# Altium footprint library smd-ipc.PCBLIB: 363 footprints (part 10 of 27)
Each footprint in its own frame and in the unit in brackets; x right, y up, seen from the top. Pads: shape width x height; smd on the part's side, far side on the other; paste and mask are expansions set on the pad; w line width, h text height; cw(c..) or ccw(c..) is an arc to the next point about the centre after c.
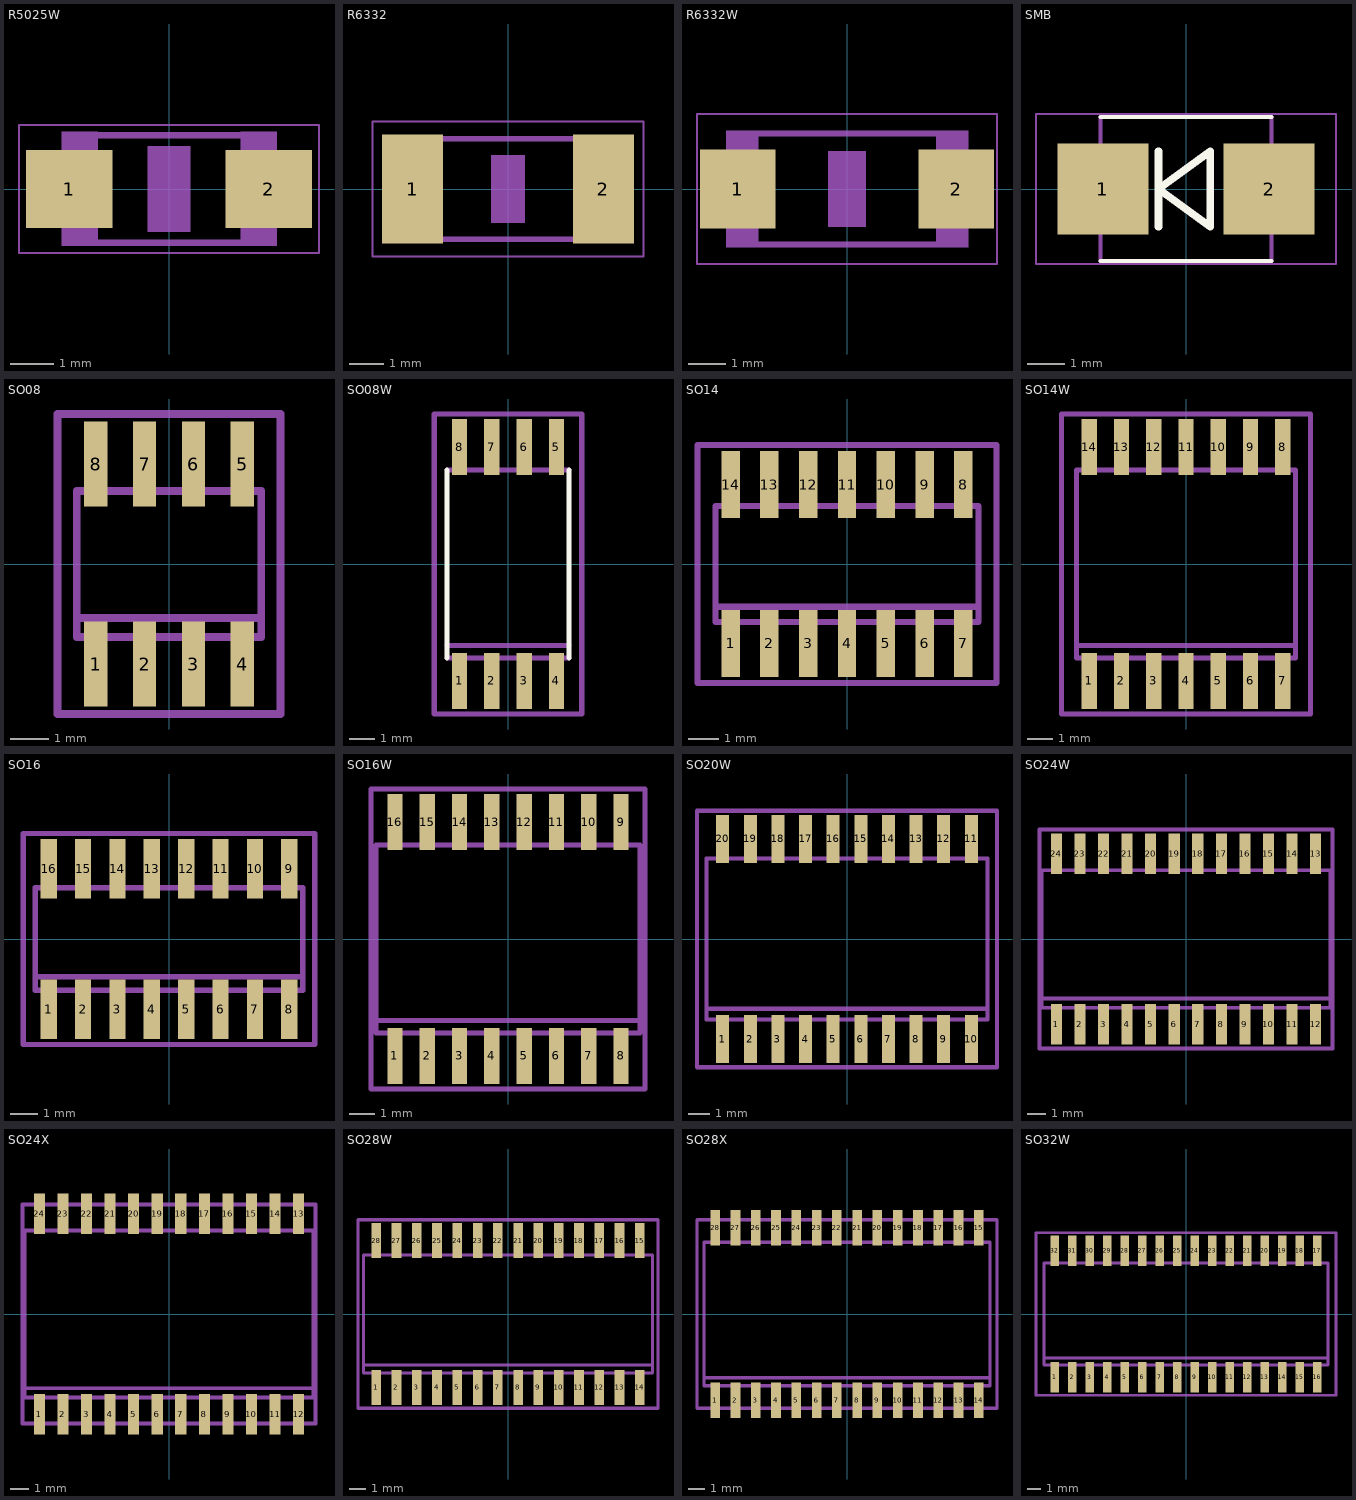
[diagram p9: the footprints below, top view; thin cyan lines are the x and y axes]

## R5025W [mm]
pads (2):
  rect 2x1.8 smd: 1(-2.311,0) 2(2.311,0)
Mechanical 6:
  rectangle: -0.5,-1 0.5,1
Mechanical 16:
  rectangle: -2.489,-1.321 -1.639,1.329
  rectangle: 1.651,-1.321 2.501,1.329
  lines w0.152: -1.662,1.245 1.662,1.245 ; -1.637,-1.245 1.687,-1.245
Mechanical 27:
  lines w0.051: -3.473,-1.483 3.473,-1.483 3.473,1.483 -3.473,1.483 -3.473,-1.483

## R6332 [mm]
pads (2):
  rect 1.8x3.2 smd: 1(-2.8,0) 2(2.8,0)
Mechanical 6:
  rectangle: -0.5,-1 0.5,1
Mechanical 16:
  rectangle: -3.2,-1.549 -2.351,1.551
  rectangle: 2.362,-1.549 3.212,1.551
  lines w0.152: -2.362,-1.473 2.387,-1.473 ; -2.362,1.473 2.387,1.473
Mechanical 27:
  lines w0.051: -3.973,-1.983 3.973,-1.983 3.973,1.983 -3.973,1.983 -3.973,-1.983

## R6332W [mm]
pads (2):
  rect 2x2.1 smd: 1(-2.896,0) 2(2.896,0)
Mechanical 6:
  rectangle: -0.5,-1 0.5,1
Mechanical 16:
  rectangle: -3.2,-1.549 -2.351,1.551
  rectangle: 2.362,-1.549 3.212,1.551
  lines w0.152: -2.362,-1.473 2.387,-1.473 ; -2.362,1.473 2.387,1.473
Mechanical 27:
  lines w0.051: -3.973,-1.983 3.973,-1.983 3.973,1.983 -3.973,1.983 -3.973,-1.983

## SMB [mm]
pads (2):
  rect 2.4x2.4 smd: 1(-2.2,0) 2(2.2,0)
Top Overlay:
  lines w0.102: -2.261,-1.905 2.261,-1.905 ; -2.261,1.905 2.261,1.905
  lines w0.203: -0.73,-1 -0.73,1 ; -0.73,0 0.643,1 0.643,-1 -0.73,0
Mechanical 16:
  rectangle: -2.794,-1.092 -2.261,1.092
  rectangle: 2.261,-1.092 2.794,1.092
  lines w0.102: -2.261,-1.905 -2.261,1.905 ; 2.261,-1.905 2.261,1.905
Mechanical 27:
  lines w0.051: -3.973,-1.983 3.973,-1.983 3.973,1.983 -3.973,1.983 -3.973,-1.983

## SO08 [mm]
pads (8):
  rect 0.6x2.2 smd: 1(-1.905,-2.6) 2(-0.635,-2.6) 3(0.635,-2.6) 4(1.905,-2.6) 5(1.905,2.6) 6(0.635,2.6) 7(-0.635,2.6) 8(-1.905,2.6)
Mechanical 16:
  rectangle: -2.15,-3.1 -1.66,-2
  rectangle: -0.88,-3.1 -0.39,-2
  rectangle: 0.39,-3.1 0.88,-2
  rectangle: 1.66,-3.1 2.15,-2
  rectangle: 1.66,2 2.15,3.1
  rectangle: 0.39,2 0.88,3.1
  rectangle: -0.88,2 -0.39,3.1
  rectangle: -2.15,2 -1.66,3.1
  lines w0.203: -2.4,-1.4 -2.4,-1.9 2.4,-1.9 2.4,-1.4 ; -2.4,-1.4 -2.4,1.9 2.4,1.9 2.4,-1.4 ; -2.4,-1.4 2.4,-1.4
Mechanical 27:
  lines w0.2: -2.9,-3.9 2.9,-3.9 2.9,3.9 -2.9,3.9 -2.9,-3.9

## SO08W [mm]
pads (8):
  rect 0.6x2.2 smd: 1(-1.905,-4.6) 2(-0.635,-4.6) 3(0.635,-4.6) 4(1.905,-4.6) 5(1.905,4.6) 6(0.635,4.6) 7(-0.635,4.6) 8(-1.905,4.6)
Top Overlay:
  lines w0.203: -2.4,-3.7 -2.4,3.7 ; 2.4,-3.7 2.4,3.7
Mechanical 16:
  rectangle: -2.15,-5.32 -1.66,-3.8
  rectangle: -0.88,-5.32 -0.39,-3.8
  rectangle: 0.39,-5.32 0.88,-3.8
  rectangle: 1.66,-5.32 2.15,-3.8
  rectangle: 1.66,3.8 2.15,5.32
  rectangle: 0.39,3.8 0.88,5.32
  rectangle: -0.88,3.8 -0.39,5.32
  rectangle: -2.15,3.8 -1.66,5.32
  lines w0.203: -2.4,-3.7 2.4,-3.7 ; -2.4,-3.2 2.4,-3.2 ; -2.4,3.7 2.4,3.7
Mechanical 27:
  lines w0.2: -2.9,-5.9 2.9,-5.9 2.9,5.9 -2.9,5.9 -2.9,-5.9

## SO14 [mm]
pads (14):
  rect 0.6x2.2 smd: 1(-3.81,-2.6) 2(-2.54,-2.6) 3(-1.27,-2.6) 4(0,-2.6) 5(1.27,-2.6) 6(2.54,-2.6) 7(3.81,-2.6) 8(3.81,2.6) 9(2.54,2.6) 10(1.27,2.6) 11(0,2.6) 12(-1.27,2.6) 13(-2.54,2.6) 14(-3.81,2.6)
Mechanical 16:
  rectangle: -4.055,-3.1 -3.565,-2
  rectangle: -2.785,-3.1 -2.295,-2
  rectangle: -1.515,-3.1 -1.025,-2
  rectangle: -0.245,-3.1 0.245,-2
  rectangle: -0.245,2 0.245,3.1
  rectangle: -1.515,2 -1.025,3.1
  rectangle: -2.785,2 -2.295,3.1
  rectangle: -4.055,2 -3.565,3.1
  rectangle: 1.025,-3.1 1.515,-2
  rectangle: 2.295,-3.1 2.785,-2
  rectangle: 3.565,-3.1 4.055,-2
  rectangle: 3.565,2 4.055,3.1
  rectangle: 2.295,2 2.785,3.1
  rectangle: 1.025,2 1.515,3.1
  lines w0.203: -4.305,-1.4 -4.305,-1.9 4.305,-1.9 4.305,-1.4 ; -4.305,-1.4 -4.305,1.9 4.305,1.9 4.305,-1.4 ; -4.305,-1.4 4.305,-1.4
Mechanical 27:
  lines w0.2: -4.895,-3.9 4.895,-3.9 4.895,3.9 -4.895,3.9 -4.895,-3.9

## SO14W [mm]
pads (14):
  rect 0.6x2.2 smd: 1(-3.81,-4.6) 2(-2.54,-4.6) 3(-1.27,-4.6) 4(0,-4.6) 5(1.27,-4.6) 6(2.54,-4.6) 7(3.81,-4.6) 8(3.81,4.6) 9(2.54,4.6) 10(1.27,4.6) 11(0,4.6) 12(-1.27,4.6) 13(-2.54,4.6) 14(-3.81,4.6)
Mechanical 16:
  rectangle: -4.055,-5.32 -3.565,-3.8
  rectangle: -2.785,-5.32 -2.295,-3.8
  rectangle: -1.515,-5.32 -1.025,-3.8
  rectangle: -0.245,-5.32 0.245,-3.8
  rectangle: 1.025,-5.32 1.515,-3.8
  rectangle: 2.295,-5.32 2.785,-3.8
  rectangle: 3.565,-5.32 4.055,-3.8
  rectangle: 3.565,3.8 4.055,5.32
  rectangle: 2.295,3.8 2.785,5.32
  rectangle: 1.025,3.8 1.515,5.32
  rectangle: -0.245,3.8 0.245,5.32
  rectangle: -1.515,3.8 -1.025,5.32
  rectangle: -2.785,3.8 -2.295,5.32
  rectangle: -4.055,3.8 -3.565,5.32
  lines w0.203: -4.305,-3.2 -4.305,-3.7 4.305,-3.7 4.305,-3.2 ; -4.305,-3.2 -4.305,3.7 4.305,3.7 4.305,-3.2 ; -4.305,-3.2 4.305,-3.2
Mechanical 27:
  lines w0.2: -4.895,-5.9 4.895,-5.9 4.895,5.9 -4.895,5.9 -4.895,-5.9

## SO16 [mm]
pads (16):
  rect 0.6x2.2 smd: 1(-4.445,-2.6) 2(-3.175,-2.6) 3(-1.905,-2.6) 4(-0.635,-2.6) 5(0.635,-2.6) 6(1.905,-2.6) 7(3.175,-2.6) 8(4.445,-2.6) 9(4.445,2.6) 10(3.175,2.6) 11(1.905,2.6) 12(0.635,2.6) 13(-0.635,2.6) 14(-1.905,2.6) 15(-3.175,2.6) 16(-4.445,2.6)
Mechanical 16:
  rectangle: -4.69,-3.1 -4.2,-2
  rectangle: -3.42,-3.1 -2.93,-2
  rectangle: -2.15,-3.1 -1.66,-2
  rectangle: -0.88,-3.1 -0.39,-2
  rectangle: 1.66,2 2.15,3.1
  rectangle: 0.39,2 0.88,3.1
  rectangle: -0.88,2 -0.39,3.1
  rectangle: -2.15,2 -1.66,3.1
  rectangle: 0.39,-3.1 0.88,-2
  rectangle: 1.66,-3.1 2.15,-2
  rectangle: 2.93,-3.1 3.42,-2
  rectangle: 4.2,-3.1 4.69,-2
  rectangle: 4.2,2 4.69,3.1
  rectangle: 2.93,2 3.42,3.1
  rectangle: -3.42,2 -2.93,3.1
  rectangle: -4.69,2 -4.2,3.1
  lines w0.203: -4.94,-1.4 -4.94,-1.9 4.94,-1.9 4.94,-1.4 ; -4.94,-1.4 -4.94,1.9 4.94,1.9 4.94,-1.4 ; -4.94,-1.4 4.94,-1.4
Mechanical 27:
  lines w0.2: -5.395,-3.9 5.395,-3.9 5.395,3.9 -5.395,3.9 -5.395,-3.9

## SO16W [mm]
pads (16):
  rect 0.6x2.2 smd: 1(-4.445,-4.6) 2(-3.175,-4.6) 3(-1.905,-4.6) 4(-0.635,-4.6) 5(0.635,-4.6) 6(1.905,-4.6) 7(3.175,-4.6) 8(4.445,-4.6) 9(4.445,4.6) 10(3.175,4.6) 11(1.905,4.6) 12(0.635,4.6) 13(-0.635,4.6) 14(-1.905,4.6) 15(-3.175,4.6) 16(-4.445,4.6)
Mechanical 16:
  rectangle: -4.69,-5.32 -4.2,-3.8
  rectangle: -3.42,-5.32 -2.93,-3.8
  rectangle: -2.15,-5.32 -1.66,-3.8
  rectangle: -0.88,-5.32 -0.39,-3.8
  rectangle: 0.39,-5.32 0.88,-3.8
  rectangle: 1.66,-5.32 2.15,-3.8
  rectangle: 2.93,-5.32 3.42,-3.8
  rectangle: 4.2,-5.32 4.69,-3.8
  rectangle: 4.2,3.8 4.69,5.32
  rectangle: 2.93,3.8 3.42,5.32
  rectangle: 1.66,3.8 2.15,5.32
  rectangle: 0.39,3.8 0.88,5.32
  rectangle: -0.88,3.8 -0.39,5.32
  rectangle: -2.15,3.8 -1.66,5.32
  rectangle: -3.42,3.8 -2.93,5.32
  rectangle: -4.69,3.8 -4.2,5.32
  lines w0.203: -5.19,-3.2 -5.19,-3.7 5.19,-3.7 5.19,-3.2 ; -5.19,-3.2 -5.19,3.7 5.19,3.7 5.19,-3.2 ; -5.19,-3.2 5.19,-3.2
Mechanical 27:
  lines w0.2: -5.395,-5.9 5.395,-5.9 5.395,5.9 -5.395,5.9 -5.395,-5.9

## SO20W [mm]
pads (20):
  rect 0.6x2.2 smd: 1(-5.715,-4.6) 2(-4.445,-4.6) 3(-3.175,-4.6) 4(-1.905,-4.6) 5(-0.635,-4.6) 6(0.635,-4.6) 7(1.905,-4.6) 8(3.175,-4.6) 9(4.445,-4.6) 10(5.715,-4.6) 11(5.715,4.6) 12(4.445,4.6) 13(3.175,4.6) 14(1.905,4.6) 15(0.635,4.6) 16(-0.635,4.6) 17(-1.905,4.6) 18(-3.175,4.6) 19(-4.445,4.6) 20(-5.715,4.6)
Mechanical 16:
  rectangle: -5.96,-5.32 -5.47,-3.8
  rectangle: -4.69,-5.32 -4.2,-3.8
  rectangle: -3.42,-5.32 -2.93,-3.8
  rectangle: -2.15,-5.32 -1.66,-3.8
  rectangle: -0.88,-5.32 -0.39,-3.8
  rectangle: 0.39,-5.32 0.88,-3.8
  rectangle: 1.66,-5.32 2.15,-3.8
  rectangle: 2.93,-5.32 3.42,-3.8
  rectangle: 4.2,-5.32 4.69,-3.8
  rectangle: 5.47,-5.32 5.96,-3.8
  rectangle: 5.47,3.8 5.96,5.32
  rectangle: 4.2,3.8 4.69,5.32
  rectangle: 2.93,3.8 3.42,5.32
  rectangle: 1.66,3.8 2.15,5.32
  rectangle: 0.39,3.8 0.88,5.32
  rectangle: -0.88,3.8 -0.39,5.32
  rectangle: -2.15,3.8 -1.66,5.32
  rectangle: -3.42,3.8 -2.93,5.32
  rectangle: -4.69,3.8 -4.2,5.32
  rectangle: -5.96,3.8 -5.47,5.32
  lines w0.203: -6.46,-3.2 -6.46,-3.7 6.46,-3.7 6.46,-3.2 ; -6.46,-3.2 -6.46,3.7 6.46,3.7 6.46,-3.2 ; -6.46,-3.2 6.46,-3.2
Mechanical 27:
  lines w0.2: -6.895,-5.9 6.895,-5.9 6.895,5.9 -6.895,5.9 -6.895,-5.9

## SO24W [mm]
pads (24):
  rect 0.6x2.2 smd: 1(-6.985,-4.6) 2(-5.715,-4.6) 3(-4.445,-4.6) 4(-3.175,-4.6) 5(-1.905,-4.6) 6(-0.635,-4.6) 7(0.635,-4.6) 8(1.905,-4.6) 9(3.175,-4.6) 10(4.445,-4.6) 11(5.715,-4.6) 12(6.985,-4.6) 13(6.985,4.6) 14(5.715,4.6) 15(4.445,4.6) 16(3.175,4.6) 17(1.905,4.6) 18(0.635,4.6) 19(-0.635,4.6) 20(-1.905,4.6) 21(-3.175,4.6) 22(-4.445,4.6) 23(-5.715,4.6) 24(-6.985,4.6)
Mechanical 16:
  rectangle: -7.23,-5.32 -6.74,-3.8
  rectangle: -5.96,-5.32 -5.47,-3.8
  rectangle: -4.69,-5.32 -4.2,-3.8
  rectangle: -3.42,-5.32 -2.93,-3.8
  rectangle: -2.15,-5.32 -1.66,-3.8
  rectangle: -0.88,-5.32 -0.39,-3.8
  rectangle: 0.39,-5.32 0.88,-3.8
  rectangle: 1.66,-5.32 2.15,-3.8
  rectangle: 2.93,-5.32 3.42,-3.8
  rectangle: 4.2,-5.32 4.69,-3.8
  rectangle: 5.47,-5.32 5.96,-3.8
  rectangle: 6.74,-5.32 7.23,-3.8
  rectangle: 6.74,3.8 7.23,5.32
  rectangle: 5.47,3.8 5.96,5.32
  rectangle: 4.2,3.8 4.69,5.32
  rectangle: 2.93,3.8 3.42,5.32
  rectangle: 1.66,3.8 2.15,5.32
  rectangle: 0.39,3.8 0.88,5.32
  rectangle: -0.88,3.8 -0.39,5.32
  rectangle: -2.15,3.8 -1.66,5.32
  rectangle: -3.42,3.8 -2.93,5.32
  rectangle: -4.69,3.8 -4.2,5.32
  rectangle: -5.96,3.8 -5.47,5.32
  rectangle: -7.23,3.8 -6.74,5.32
  lines w0.203: -7.78,-3.2 -7.78,-3.7 7.78,-3.7 7.78,-3.2 ; -7.78,-3.2 -7.78,3.7 7.78,3.7 7.78,-3.2 ; -7.78,-3.2 7.78,-3.2
Mechanical 27:
  lines w0.2: -7.895,-5.9 7.895,-5.9 7.895,5.9 -7.895,5.9 -7.895,-5.9

## SO24X [mm]
pads (24):
  rect 0.6x2.2 smd: 1(-6.985,-5.4) 2(-5.715,-5.4) 3(-4.445,-5.4) 4(-3.175,-5.4) 5(-1.905,-5.4) 6(-0.635,-5.4) 7(0.635,-5.4) 8(1.905,-5.4) 9(3.175,-5.4) 10(4.445,-5.4) 11(5.715,-5.4) 12(6.985,-5.4) 13(6.985,5.4) 14(5.715,5.4) 15(4.445,5.4) 16(3.175,5.4) 17(1.905,5.4) 18(0.635,5.4) 19(-0.635,5.4) 20(-1.905,5.4) 21(-3.175,5.4) 22(-4.445,5.4) 23(-5.715,5.4) 24(-6.985,5.4)
Mechanical 16:
  rectangle: -7.23,-6.12 -6.74,-4.6
  rectangle: -5.96,-6.12 -5.47,-4.6
  rectangle: -4.69,-6.12 -4.2,-4.6
  rectangle: -3.42,-6.12 -2.93,-4.6
  rectangle: -2.15,-6.12 -1.66,-4.6
  rectangle: -0.88,-6.12 -0.39,-4.6
  rectangle: 0.39,-6.12 0.88,-4.6
  rectangle: 1.66,-6.12 2.15,-4.6
  rectangle: 2.93,-6.12 3.42,-4.6
  rectangle: 4.2,-6.12 4.69,-4.6
  rectangle: 5.47,-6.12 5.96,-4.6
  rectangle: 6.74,-6.12 7.23,-4.6
  rectangle: 6.74,4.6 7.23,6.12
  rectangle: 5.47,4.6 5.96,6.12
  rectangle: 4.2,4.6 4.69,6.12
  rectangle: 2.93,4.6 3.42,6.12
  rectangle: 1.66,4.6 2.15,6.12
  rectangle: 0.39,4.6 0.88,6.12
  rectangle: -0.88,4.6 -0.39,6.12
  rectangle: -2.15,4.6 -1.66,6.12
  rectangle: -3.42,4.6 -2.93,6.12
  rectangle: -4.69,4.6 -4.2,6.12
  rectangle: -5.96,4.6 -5.47,6.12
  rectangle: -7.23,4.6 -6.74,6.12
  lines w0.203: -7.78,-4 -7.78,-4.5 7.78,-4.5 7.78,-4 ; -7.78,-4 -7.78,4.5 7.78,4.5 7.78,-4 ; -7.78,-4 7.78,-4
Mechanical 27:
  lines w0.2: -7.895,-5.9 7.895,-5.9 7.895,5.9 -7.895,5.9 -7.895,-5.9

## SO28W [mm]
pads (28):
  rect 0.6x2.2 smd: 1(-8.255,-4.6) 2(-6.985,-4.6) 3(-5.715,-4.6) 4(-4.445,-4.6) 5(-3.175,-4.6) 6(-1.905,-4.6) 7(-0.635,-4.6) 8(0.635,-4.6) 9(1.905,-4.6) 10(3.175,-4.6) 11(4.445,-4.6) 12(5.715,-4.6) 13(6.985,-4.6) 14(8.255,-4.6) 15(8.255,4.6) 16(6.985,4.6) 17(5.715,4.6) 18(4.445,4.6) 19(3.175,4.6) 20(1.905,4.6) 21(0.635,4.6) 22(-0.635,4.6) 23(-1.905,4.6) 24(-3.175,4.6) 25(-4.445,4.6) 26(-5.715,4.6) 27(-6.985,4.6) 28(-8.255,4.6)
Mechanical 16:
  rectangle: -8.5,-5.32 -8.01,-3.8
  rectangle: -7.23,-5.32 -6.74,-3.8
  rectangle: -5.96,-5.32 -5.47,-3.8
  rectangle: -4.69,-5.32 -4.2,-3.8
  rectangle: -3.42,-5.32 -2.93,-3.8
  rectangle: -2.15,-5.32 -1.66,-3.8
  rectangle: -0.88,-5.32 -0.39,-3.8
  rectangle: 0.39,-5.32 0.88,-3.8
  rectangle: 1.66,-5.32 2.15,-3.8
  rectangle: 2.93,-5.32 3.42,-3.8
  rectangle: 4.2,-5.32 4.69,-3.8
  rectangle: 5.47,-5.32 5.96,-3.8
  rectangle: 6.74,-5.32 7.23,-3.8
  rectangle: 8.01,-5.32 8.5,-3.8
  rectangle: 8.01,3.8 8.5,5.32
  rectangle: 6.74,3.8 7.23,5.32
  rectangle: 5.47,3.8 5.96,5.32
  rectangle: 4.2,3.8 4.69,5.32
  rectangle: 2.93,3.8 3.42,5.32
  rectangle: 1.66,3.8 2.15,5.32
  rectangle: 0.39,3.8 0.88,5.32
  rectangle: -0.88,3.8 -0.39,5.32
  rectangle: -2.15,3.8 -1.66,5.32
  rectangle: -3.42,3.8 -2.93,5.32
  rectangle: -4.69,3.8 -4.2,5.32
  rectangle: -5.96,3.8 -5.47,5.32
  rectangle: -7.23,3.8 -6.74,5.32
  rectangle: -8.5,3.8 -8.01,5.32
  lines w0.203: -9.05,-3.2 -9.05,-3.7 9.05,-3.7 9.05,-3.2 ; -9.05,-3.2 -9.05,3.7 9.05,3.7 9.05,-3.2 ; -9.05,-3.2 9.05,-3.2
Mechanical 27:
  lines w0.2: -9.395,-5.9 9.395,-5.9 9.395,5.9 -9.395,5.9 -9.395,-5.9

## SO28X [mm]
pads (28):
  rect 0.6x2.2 smd: 1(-8.255,-5.4) 2(-6.985,-5.4) 3(-5.715,-5.4) 4(-4.445,-5.4) 5(-3.175,-5.4) 6(-1.905,-5.4) 7(-0.635,-5.4) 8(0.635,-5.4) 9(1.905,-5.4) 10(3.175,-5.4) 11(4.445,-5.4) 12(5.715,-5.4) 13(6.985,-5.4) 14(8.255,-5.4) 15(8.255,5.4) 16(6.985,5.4) 17(5.715,5.4) 18(4.445,5.4) 19(3.175,5.4) 20(1.905,5.4) 21(0.635,5.4) 22(-0.635,5.4) 23(-1.905,5.4) 24(-3.175,5.4) 25(-4.445,5.4) 26(-5.715,5.4) 27(-6.985,5.4) 28(-8.255,5.4)
Mechanical 16:
  rectangle: -8.5,-6.12 -8.01,-4.6
  rectangle: -7.23,-6.12 -6.74,-4.6
  rectangle: -5.96,-6.12 -5.47,-4.6
  rectangle: -4.69,-6.12 -4.2,-4.6
  rectangle: -3.42,-6.12 -2.93,-4.6
  rectangle: -2.15,-6.12 -1.66,-4.6
  rectangle: -0.88,-6.12 -0.39,-4.6
  rectangle: 0.39,-6.12 0.88,-4.6
  rectangle: 1.66,-6.12 2.15,-4.6
  rectangle: 2.93,-6.12 3.42,-4.6
  rectangle: 4.2,-6.12 4.69,-4.6
  rectangle: 5.47,-6.12 5.96,-4.6
  rectangle: 6.74,-6.12 7.23,-4.6
  rectangle: 8.01,-6.12 8.5,-4.6
  rectangle: 8.01,4.6 8.5,6.12
  rectangle: 6.74,4.6 7.23,6.12
  rectangle: 5.47,4.6 5.96,6.12
  rectangle: 4.2,4.6 4.69,6.12
  rectangle: 2.93,4.6 3.42,6.12
  rectangle: 1.66,4.6 2.15,6.12
  rectangle: 0.39,4.6 0.88,6.12
  rectangle: -0.88,4.6 -0.39,6.12
  rectangle: -2.15,4.6 -1.66,6.12
  rectangle: -3.42,4.6 -2.93,6.12
  rectangle: -4.69,4.6 -4.2,6.12
  rectangle: -5.96,4.6 -5.47,6.12
  rectangle: -7.23,4.6 -6.74,6.12
  rectangle: -8.5,4.6 -8.01,6.12
  lines w0.203: -8.95,-4 -8.95,-4.5 8.95,-4.5 8.95,-4 ; -8.95,-4 -8.95,4.5 8.95,4.5 8.95,-4 ; -8.95,-4 8.95,-4
Mechanical 27:
  lines w0.2: -9.395,-5.9 9.395,-5.9 9.395,5.9 -9.395,5.9 -9.395,-5.9

## SO32W [mm]
pads (32):
  rect 0.6x2.2 smd: 1(-9.525,-4.6) 2(-8.255,-4.6) 3(-6.985,-4.6) 4(-5.715,-4.6) 5(-4.445,-4.6) 6(-3.175,-4.6) 7(-1.905,-4.6) 8(-0.635,-4.6) 9(0.635,-4.6) 10(1.905,-4.6) 11(3.175,-4.6) 12(4.445,-4.6) 13(5.715,-4.6) 14(6.985,-4.6) 15(8.255,-4.6) 16(9.525,-4.6) 17(9.525,4.6) 18(8.255,4.6) 19(6.985,4.6) 20(5.715,4.6) 21(4.445,4.6) 22(3.175,4.6) 23(1.905,4.6) 24(0.635,4.6) 25(-0.635,4.6) 26(-1.905,4.6) 27(-3.175,4.6) 28(-4.445,4.6) 29(-5.715,4.6) 30(-6.985,4.6) 31(-8.255,4.6) 32(-9.525,4.6)
Mechanical 16:
  rectangle: -9.77,-5.32 -9.28,-3.8
  rectangle: -8.5,-5.32 -8.01,-3.8
  rectangle: -7.23,-5.32 -6.74,-3.8
  rectangle: -5.96,-5.32 -5.47,-3.8
  rectangle: -4.69,-5.32 -4.2,-3.8
  rectangle: -3.42,-5.32 -2.93,-3.8
  rectangle: -2.15,-5.32 -1.66,-3.8
  rectangle: -0.88,-5.32 -0.39,-3.8
  rectangle: 0.39,-5.32 0.88,-3.8
  rectangle: 1.66,-5.32 2.15,-3.8
  rectangle: 2.93,-5.32 3.42,-3.8
  rectangle: 4.2,-5.32 4.69,-3.8
  rectangle: 5.47,-5.32 5.96,-3.8
  rectangle: 6.74,-5.32 7.23,-3.8
  rectangle: 8.01,-5.32 8.5,-3.8
  rectangle: 9.28,-5.32 9.77,-3.8
  rectangle: 9.28,3.8 9.77,5.32
  rectangle: 8.01,3.8 8.5,5.32
  rectangle: 6.74,3.8 7.23,5.32
  rectangle: 5.47,3.8 5.96,5.32
  rectangle: 4.2,3.8 4.69,5.32
  rectangle: 2.93,3.8 3.42,5.32
  rectangle: 1.66,3.8 2.15,5.32
  rectangle: 0.39,3.8 0.88,5.32
  rectangle: -0.88,3.8 -0.39,5.32
  rectangle: -2.15,3.8 -1.66,5.32
  rectangle: -3.42,3.8 -2.93,5.32
  rectangle: -4.69,3.8 -4.2,5.32
  rectangle: -5.96,3.8 -5.47,5.32
  rectangle: -7.23,3.8 -6.74,5.32
  rectangle: -8.5,3.8 -8.01,5.32
  rectangle: -9.77,3.8 -9.28,5.32
  lines w0.203: -10.32,-3.2 -10.32,-3.7 10.32,-3.7 10.32,-3.2 ; -10.32,-3.2 -10.32,3.7 10.32,3.7 10.32,-3.2 ; -10.32,-3.2 10.32,-3.2
Mechanical 27:
  lines w0.2: -10.895,-5.9 10.895,-5.9 10.895,5.9 -10.895,5.9 -10.895,-5.9